# Altium footprint library PCBLIB.PcbLib: 775 footprints (part 40 of 49)
Each footprint in its own frame and in the unit in brackets; x right, y up, seen from the top. Pads: shape width x height; smd on the part's side, far side on the other; paste and mask are expansions set on the pad; w line width, h text height; cw(c..) or ccw(c..) is an arc to the next point about the centre after c.
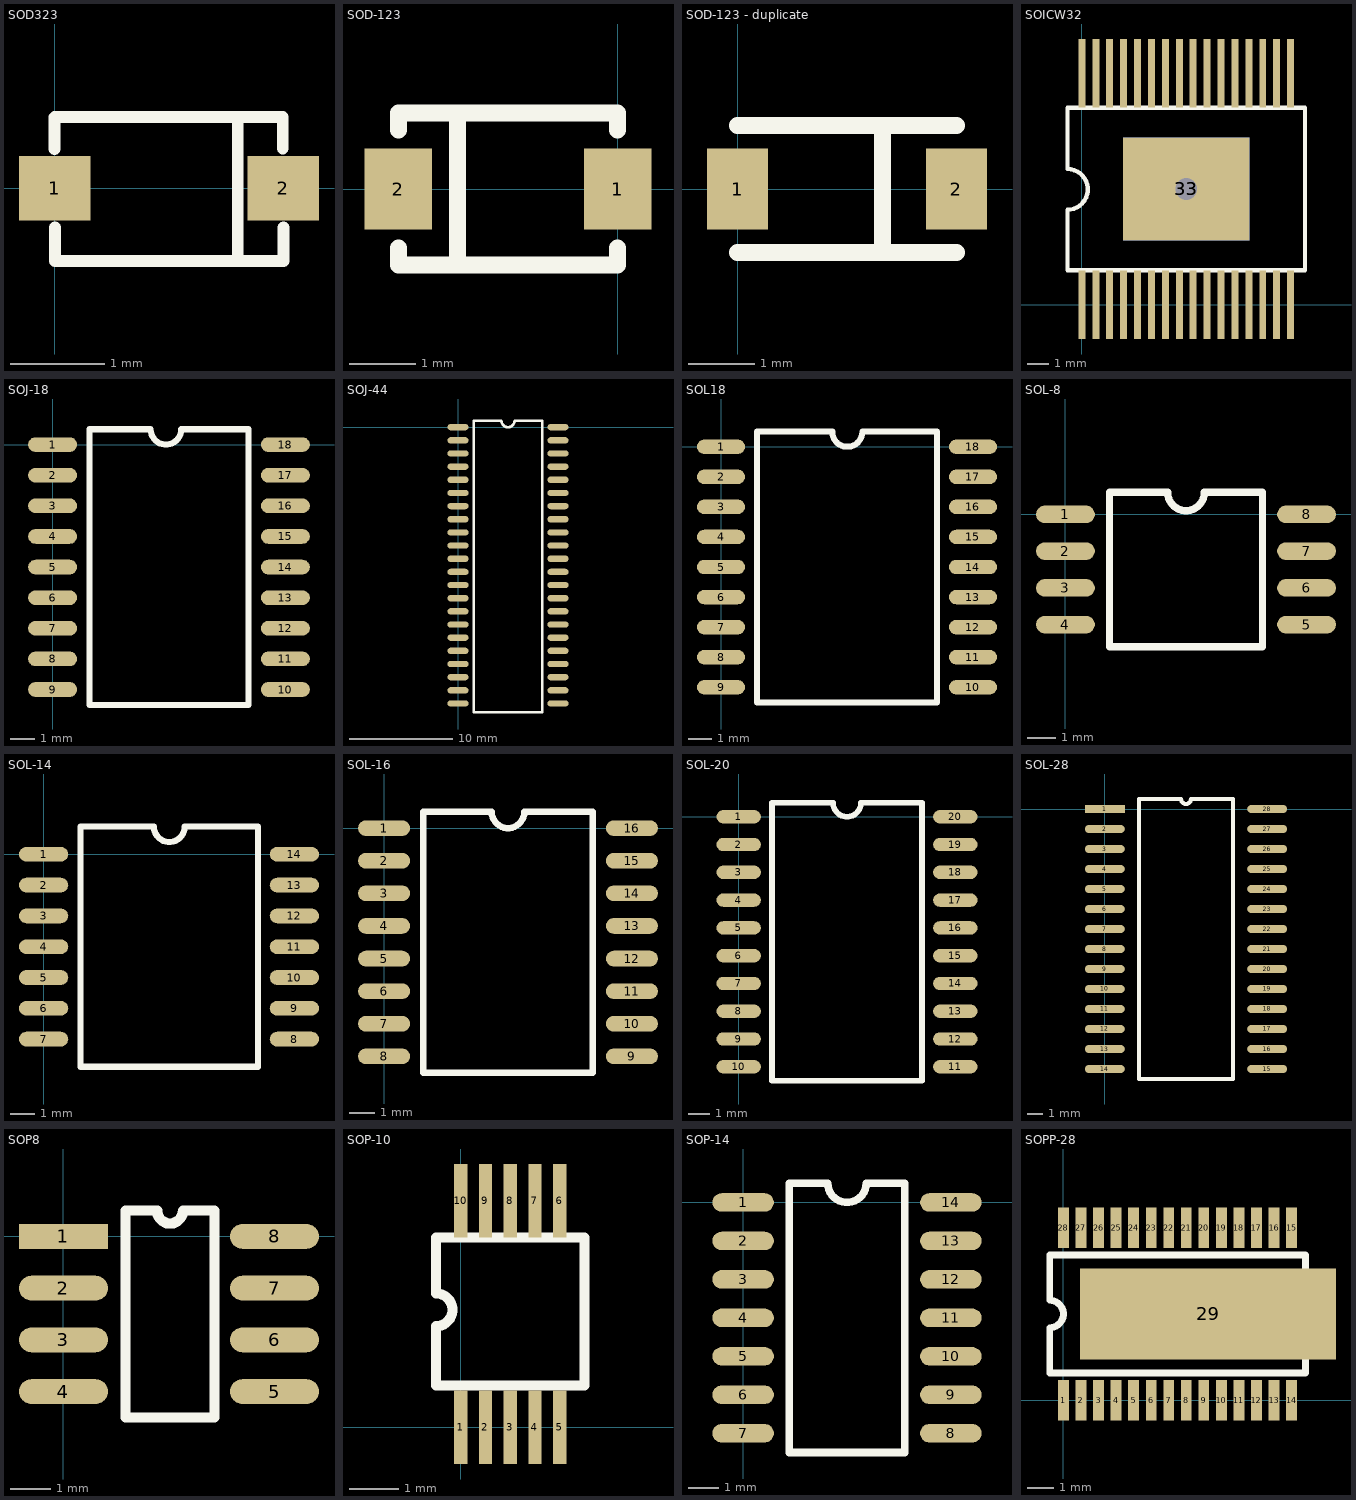
[diagram p39: the footprints below, top view; thin cyan lines are the x and y axes]

## SOD323 [mil]
height 45
pads (2):
  rect 30x27 smd: 1(0,0) 2(96,0)
TopOverlay:
  lines w5: -0.01,16.56 -0.01,29.87 0.03,29.91 95.79,29.91 95.79,16.78 ; 0.11,-16.46 0.11,-30.44 96.01,-30.44 96.01,-16.46 ; 76.87,-30.44 76.87,29.91

## SOD-123 [mil]
pads (2):
  rect 40x48 smd: 1(0,0) 2(-130,0)
TopOverlay:
  lines w10: -130,-35 -130,-45 0,-45 0,-35 ; -95,-45 -95,45 ; 0,35 0,45 -130,45 ; -130,45 -130,35 -130,45
Mechanical4:
  text ".065" at -130,0 h1

## SOD-123 - duplicate [mil]
height 55
pads (2):
  rect 36x48 smd: 1(0,0) 2(129,0)
TopOverlay:
  lines w10: 0,-37.5 129,-37.5 ; 0,37.5 129,37.5 ; 85.5,-34.5 85.5,37.5

## SOICW32 [mm]
height 2.65
pads (34):
  rect 0.325x3.208 smd: 1(0,0) 2(0.65,0) 3(1.3,0) 4(1.95,0) 5(2.6,0) 6(3.25,0) 7(3.9,0) 8(4.55,0) 9(5.2,0) 10(5.85,0) 11(6.5,0) 12(7.15,0) 13(7.8,0) 14(8.45,0) 15(9.1,0) 16(9.75,0) 17(9.75,10.808) 18(9.1,10.808) 19(8.45,10.808) 20(7.8,10.808) 21(7.15,10.808) 22(6.5,10.808) 23(5.85,10.808) 24(5.2,10.808) 25(4.55,10.808) 26(3.9,10.808) 27(3.25,10.808) 28(2.6,10.808) 29(1.95,10.808) 30(1.3,10.808) 31(0.65,10.808) 32(0,10.808)
  rect 5.9x4.8 smd: 33(4.875,5.404)
  rect 5.9x4.8 smd far side: 33(4.875,5.404)
via 4.875,5.404 diameter 1.651 hole 1.016
TopOverlay:
  lines w0.203: -0.675,1.604 10.425,1.604 10.425,9.204 -0.675,9.204 -0.675,6.338 cw(c-0.675,5.387) -0.675,4.436 -0.675,1.604

## SOJ-18 [mil]
pads (18):
  oval 80x24 smd: 1(0,0) 2(0,-50) 3(0,-100) 4(0,-150) 5(0,-200) 6(0,-250) 7(0,-300) 8(0,-350) 9(0,-400) 10(380,-400) 11(380,-350) 12(380,-300) 13(380,-250) 14(380,-200) 15(380,-150) 16(380,-100) 17(380,-50) 18(380,0)
TopOverlay:
  lines w10: 60,-425 60,25 160,25 ccw(c185,25) 210,25 320,25 320,-425 60,-425

## SOJ-44 [mil]
pads (44):
  oval 80x24 smd: 1(0,0) 2(0,-50) 3(0,-100) 4(0,-150) 5(0,-200) 6(0,-250) 7(0,-300) 8(0,-350) 9(0,-400) 10(0,-450) 11(0,-500) 12(0,-550) 13(0,-600) 14(0,-650) 15(0,-700) 16(0,-750) 17(0,-800) 18(0,-850) 19(0,-900) 20(0,-950) 21(0,-1000) 22(0,-1050) 23(380,-1050) 24(380,-1000) 25(380,-950) 26(380,-900) 27(380,-850) 28(380,-800) 29(380,-750) 30(380,-700) 31(380,-650) 32(380,-600) 33(380,-550) 34(380,-500) 35(380,-450) 36(380,-400) 37(380,-350) 38(380,-300) 39(380,-250) 40(380,-200) 41(380,-150) 42(380,-100) 43(380,-50) 44(380,0)
TopOverlay:
  lines w10: 60,-1083.46 60,25 165,25 ccw(c190,25) 215,25 320,25 320,-1083.46 60,-1083.46

## SOL18 [mil]
pads (18):
  oval 80x24 smd: 1(0,0) 2(0,-50) 3(0,-100) 4(0,-150) 5(0,-200) 6(0,-250) 7(0,-300) 8(0,-350) 9(0,-400) 10(419,-400) 11(419,-350) 12(419,-300) 13(419,-250) 14(419,-200) 15(419,-150) 16(419,-100) 17(419,-50) 18(419,0)
TopOverlay:
  lines w10: 312,-425 359,-425 359,25 235,25 cw(c210,25) 185,25 60,25 60,-425 320,-425

## SOL-8 [mil]
pads (8):
  oval 80x24 smd: 1(0,0) 2(0,-50) 3(0,-100) 4(0,-150) 5(328,-150) 6(328,-100) 7(328,-50) 8(328,0)
TopOverlay:
  lines w10: 60,-180 60,30 85,30 139,30 ccw(c164,30) 189,30 268,30 268,-180 60,-180
Mechanical4:
  text ".065" at -0.44,0.48 h1
  text ".062" at 0,0 h1

## SOL-14 [mil]
pads (14):
  oval 80x24 smd: 1(0,0) 2(0,-50) 3(0,-100) 4(0,-150) 5(0,-200) 6(0,-250) 7(0,-300) 8(407,-300) 9(407,-250) 10(407,-200) 11(407,-150) 12(407,-100) 13(407,-50) 14(407,0)
TopOverlay:
  lines w10: 178,45 60,45 60,-345 348,-345 348,45 229,45 cw(c204,45) 179,45
Mechanical4:
  text ".215" at 0,0 h1

## SOL-16 [mil]
pads (16):
  oval 80x24 smd: 1(0,0) 2(0,-50) 3(0,-100) 4(0,-150) 5(0,-200) 6(0,-250) 7(0,-300) 8(0,-350) 9(380,-350) 10(380,-300) 11(380,-250) 12(380,-200) 13(380,-150) 14(380,-100) 15(380,-50) 16(380,0)
TopOverlay:
  lines w10: 60,-375 320,-375 320,25 215,25 cw(c190,25) 165,25 60,25 60,-375
Mechanical4:
  text ".062" at 0,0 h1

## SOL-20 [mil]
pads (20):
  oval 80x24 smd: 1(0,0) 2(0,-50) 3(0,-100) 4(0,-150) 5(0,-200) 6(0,-250) 7(0,-300) 8(0,-350) 9(0,-400) 10(0,-450) 11(390,-450) 12(390,-400) 13(390,-350) 14(390,-300) 15(390,-250) 16(390,-200) 17(390,-150) 18(390,-100) 19(390,-50) 20(390,0)
TopOverlay:
  lines w10: 60,-475 330,-475 330,25 220,25 cw(c195,25) 170,25 60,25 60,-475
Mechanical4:
  text ".105" at 0,0 h1
  text ".065" at 0,-0.48 h1

## SOL-28 [mil]
height 110
pads (28):
  rect 100x20 smd: 1(0,0)
  oval 100x20 smd: 2(0,-50) 3(0,-100) 4(0,-150) 5(0,-200) 6(0,-250) 7(0,-300) 8(0,-350) 9(0,-400) 10(0,-450) 11(0,-500) 12(0,-550) 13(0,-600) 14(0,-650) 15(406,-650) 16(406,-600) 17(406,-550) 18(406,-500) 19(406,-450) 20(406,-400) 21(406,-350) 22(406,-300) 23(406,-250) 24(406,-200) 25(406,-150) 26(406,-100) 27(406,-50) 28(406,0)
TopOverlay:
  lines w10: 85,-675 85,25 190.5,25 ccw(c203,25) 215.5,25 321,25 321,-675 85,-675

## SOP8 [mil]
pads (8):
  rect 86x24 smd: 1(0,0)
  oval 86x24 smd: 2(0,-50) 3(0,-100) 4(0,-150) 5(204,-150) 6(204,-100) 7(204,-50) 8(204,0)
TopOverlay:
  lines w10: 60,25 60,-175 146,-175 146,25 126,25 115.5,25 cw(c103,25) 90.5,25 81,25 60.5,25
Mechanical4:
  text ".040" at 0,0 h1

## SOP-10 [mm]
height 1.1
pads (10):
  rect 0.27x1.483 smd: 1(0,0) 2(0.5,0) 3(1,0) 4(1.5,0) 5(2,0) 6(2,4.585) 7(1.5,4.585) 8(1,4.585) 9(0.5,4.585) 10(0,4.585)
TopOverlay:
  lines w0.203: -0.5,0.843 -0.5,2.045 ccw(c-0.5,2.377) -0.5,2.708 -0.5,3.843 2.5,3.843 2.5,0.843 -0.5,0.843

## SOP-14 [mil]
pads (14):
  oval 80x24 smd: 1(0,0) 2(0,-50) 3(0,-100) 4(0,-150) 5(0,-200) 6(0,-250) 7(0,-300) 8(270,-300) 9(270,-250) 10(270,-200) 11(270,-150) 12(270,-100) 13(270,-50) 14(270,0)
TopOverlay:
  lines w10: 60,-325 60,25 110,25 ccw(c135,25) 160,25 210,25 210,-325 60,-325
Mechanical4:
  text ".065" at 25.19,0.86 h1
  text ".062" at 25,0 h1

## SOPP-28 [mm]
height 2.54
pads (29):
  rect 0.4x1.5 smd: 1(0,0) 2(0.65,0) 3(1.3,0) 4(1.95,0) 5(2.6,0) 6(3.25,0) 7(3.9,0) 8(4.55,0) 9(5.2,0) 10(5.85,0) 11(6.5,0) 12(7.15,0) 13(7.8,0) 14(8.45,0) 15(8.45,6.401) 16(7.8,6.401) 17(7.15,6.401) 18(6.5,6.401) 19(5.85,6.401) 20(5.2,6.401) 21(4.55,6.401) 22(3.9,6.401) 23(3.25,6.401) 24(2.6,6.401) 25(1.95,6.401) 26(1.3,6.401) 27(0.65,6.401) 28(0,6.401)
  rect 9.474x3.353 smd: 29(5.359,3.2)
TopOverlay:
  lines w0.254: -0.508,1.016 -0.508,2.692 ccw(c-0.508,3.2) -0.508,3.708 -0.508,5.385 8.966,5.385 8.966,1.016 -0.508,1.016